# Altium footprint library 我的元件库01.PcbLib: 321 footprints (part 17 of 21)
Each footprint in its own frame and in the unit in brackets; x right, y up, seen from the top. Pads: shape width x height; smd on the part's side, far side on the other; paste and mask are expansions set on the pad; w line width, h text height; cw(c..) or ccw(c..) is an arc to the next point about the centre after c.
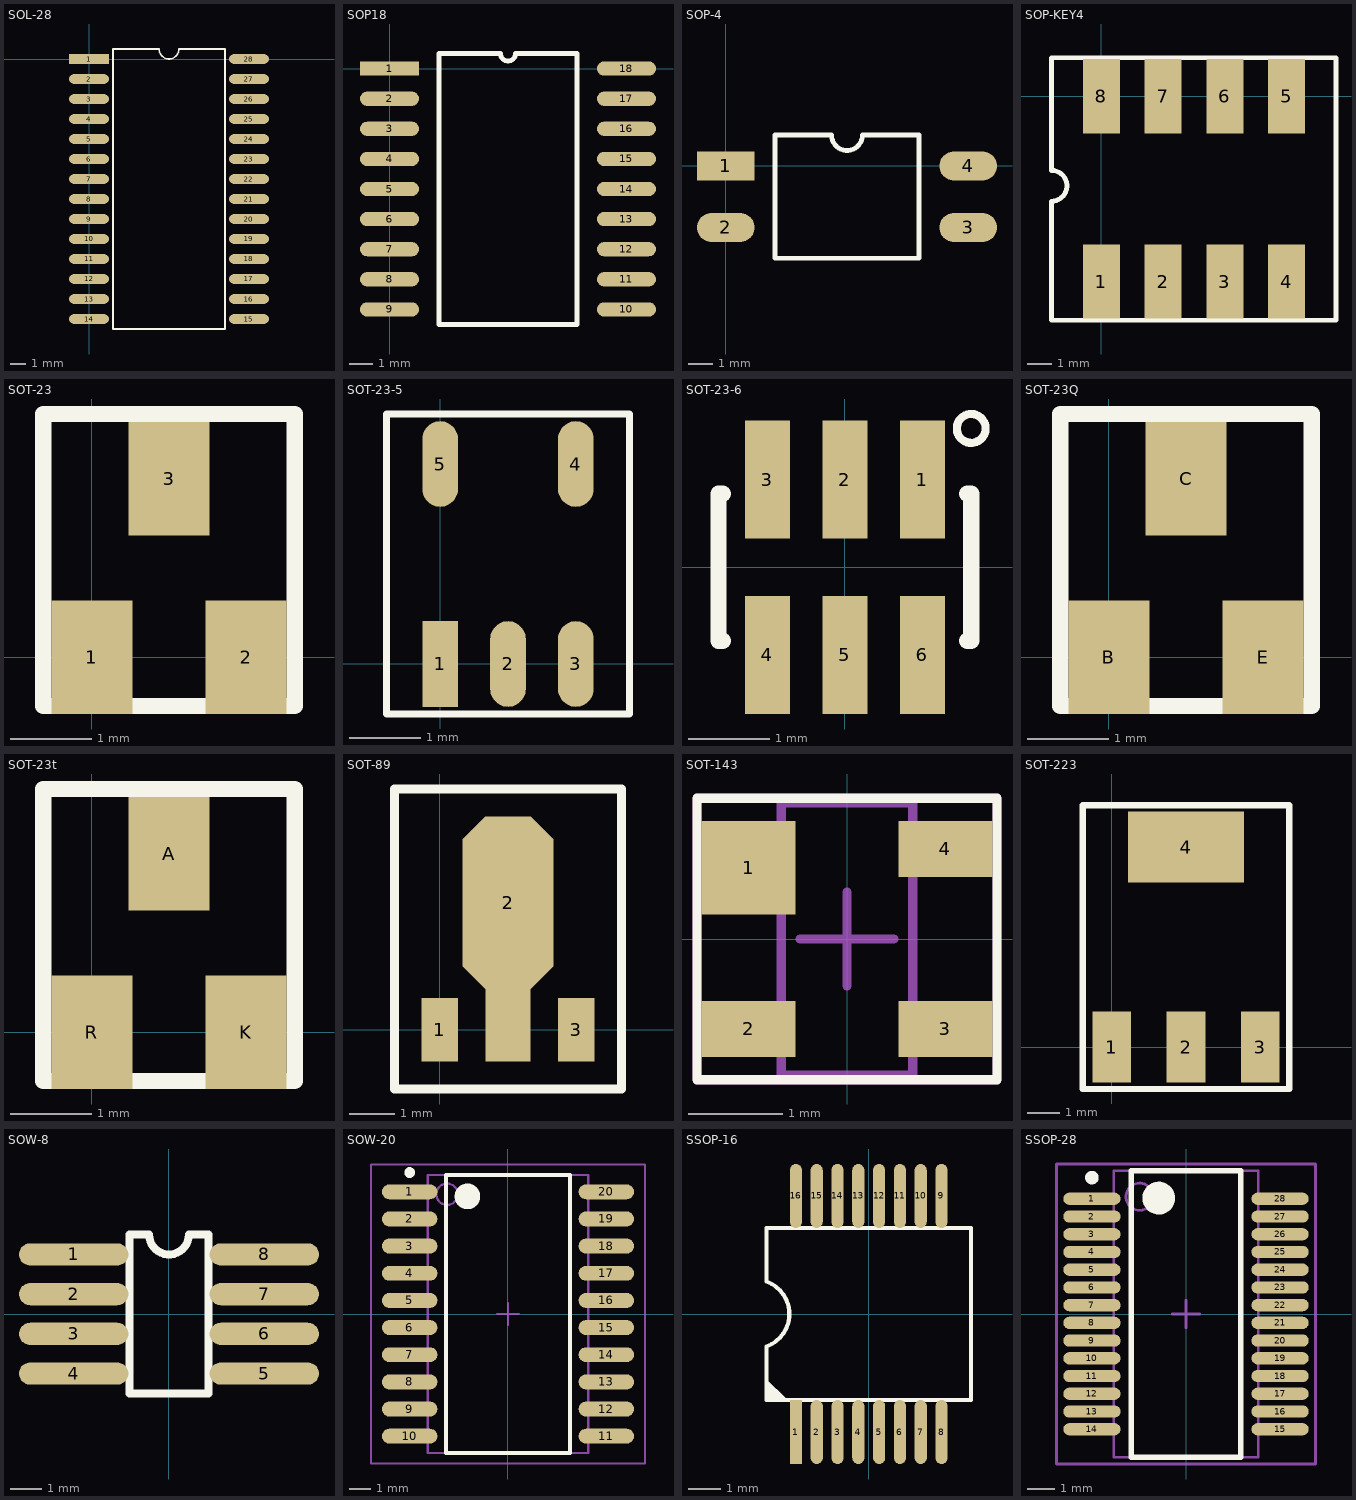
[diagram p16: the footprints below, top view; thin cyan lines are the x and y axes]

## SOL-28 [mil]
pads (28):
  rect 100x24 smd: 1(0,0)
  oval 100x24 smd: 2(0,-50) 3(0,-100) 4(0,-150) 5(0,-200) 6(0,-250) 7(0,-300) 8(0,-350) 9(0,-400) 10(0,-450) 11(0,-500) 12(0,-550) 13(0,-600) 14(0,-650) 15(400,-650) 16(400,-600) 17(400,-550) 18(400,-500) 19(400,-450) 20(400,-400) 21(400,-350) 22(400,-300) 23(400,-250) 24(400,-200) 25(400,-150) 26(400,-100) 27(400,-50) 28(400,0)
Top Overlay:
  lines w4: 60,-675 60,25 175,25 ccw(c200,25) 225,25 340,25 340,-675 60,-675
3D body "User Library-80072036 SO28.STEP": height 103.54, standoff -0.39, extent -12.08,-681.91 408,29.91

## SOP18 [mm]
pads (18):
  rect 2.5x0.6 smd: 1(0,0)
  oval 2.5x0.6 smd: 2(0,-1.27) 3(0,-2.54) 4(0,-3.81) 5(0,-5.08) 6(0,-6.35) 7(0,-7.62) 8(0,-8.89) 9(0,-10.16) 10(10,-10.16) 11(10,-8.89) 12(10,-7.62) 13(10,-6.35) 14(10,-5.08) 15(10,-3.81) 16(10,-2.54) 17(10,-1.27) 18(10,0)
Top Overlay:
  lines w0.2: 2.085,-10.795 2.085,0.635 4.683,0.635 ccw(c5,0.635) 5.318,0.635 7.915,0.635 7.915,-10.795 2.085,-10.795

## SOP-4 [mm] "PC817光耦"
height 4
pads (4):
  rect 2.38x1.2 smd: 1(0.005,0.003)
  oval 2.38x1.2 smd: 2(0.005,-2.537) 3(10.005,-2.537) 4(10.005,0.003)
Top Overlay:
  lines w0.2: 2.03,-3.807 7.98,-3.807 7.98,1.273 5.64,1.273 cw(c5.005,1.273) 4.37,1.273 2.03,1.273 2.03,-3.807
3D body "User Library-4-SMD.STEP": height 3.75, standoff -0.01, extent -0.025,-3.543 10.135,1.054

## SOP-KEY4 [mil]
pads (8):
  rect 60x120 smd: 1(0,-300) 2(100,-300) 3(200,-300) 4(300,-300) 5(300,0) 6(200,0) 7(100,0) 8(0,0)
Top Overlay:
  lines w7.87: -80.71,-120.08 cw(c-80.71,-145.08) -80.71,-170.08 -80.71,-362.6 380,-362.6 380,62.21 -80.71,62.21 -80.71,-118.9
3D body "User Library-DIPSW8.step": height 296, standoff -101, extent -76,-340 374,40

## SOT-23 [mm]
pads (3):
  rect 1x1.4 smd: 1(0,0) 2(1.9,0) 3(0.95,2.2)
Top Overlay:
  lines w0.2: -0.6,-0.6 2.5,-0.6 2.5,3 -0.6,3 -0.6,-0.6
3D body "SOT-23-3.STEP": height -0.38, standoff -1.58, extent -0.512,-0.181 2.388,2.619

## SOT-23-5 [mm]
pads (5):
  rect 0.5x1.2 smd: 1(0,0)
  oval 0.5x1.2 smd: 2(0.95,0) 3(1.9,0) 4(1.9,2.8) 5(0,2.8)
Top Overlay:
  lines w0.1: -0.75,-0.7 -0.75,3.5 2.65,3.5 2.65,-0.7 -0.75,-0.7
3D body "SOT-23-5.STEP": height -0.38, standoff -1.58, extent -0.487,0.073 2.413,2.873

## SOT-23-6 [mm] "SOT-23/SC-74A; 5 Leads; Body 3.1 x 3 mm, inc. leads (LxW max)"
height 1.45
pads (6):
  rect 0.55x1.45 smd: 1(0.95,1.075) 2(0,1.075) 3(-0.95,1.075) 4(-0.95,-1.075) 5(0,-1.075) 6(0.95,-1.075)
Top Overlay:
  circle w0.1: c1.549,1.702 r0.177
  lines w0.2: -1.5,-0.9 -1.55,-0.9 -1.55,0.9 -1.5,0.9 ; 1.5,-0.9 1.55,-0.9 1.55,0.9 1.5,0.9
3D body "User Library-SOT-23-6.STEP": height 1.08, standoff -0.01, extent -1.397,-1.194 1.397,1.232

## SOT-23Q [mm]
pads (3):
  rect 1x1.4 smd: B(0,0) C(0.95,2.2) E(1.9,0)
Top Overlay:
  lines w0.2: -0.6,-0.6 2.5,-0.6 2.5,3 -0.6,3 -0.6,-0.6
3D body "SOT-23-3.STEP": height -0.38, standoff -1.58, extent -0.457,-0.232 2.443,2.568

## SOT-23t [mm]
pads (3):
  rect 1x1.4 smd: A(0.95,2.2) K(1.9,0) R(0,0)
Top Overlay:
  lines w0.2: -0.6,-0.6 2.5,-0.6 2.5,3 -0.6,3 -0.6,-0.6
3D body "SOT-23-3.STEP": height -0.38, standoff -1.58, extent -0.485,-0.285 2.415,2.515

## SOT-89 [mm]
pads (4):
  rect 0.8x1.4 smd: 1(0,0) 3(3,0)
  oct 2x3.8 smd: 2(1.5,2.8)
  rect 1x1.854 smd: ""(1.5,0.227)
Top Overlay:
  lines w0.2: -1,-1.3 -1,5.3 4,5.3 4,-1.3 -1,-1.3
3D body "SOT-89.STEP": height -0.38, standoff -1.89, extent -0.737,-0.118 3.763,4.182

## SOT-143 [mm] "SOT143, 4-Leads, Body 3.0x2.6mm (max), Pitch 1.92mm, IPC Medium Density"
height 1.2
pads (4):
  rect 1x1 smd: 1(-1.05,0.76)
  rect 1x0.6 smd: 2(-1.05,-0.96) 3(1.05,-0.96) 4(1.05,0.96)
Top Overlay:
  lines w0.1: -1.6,-1.5 -1.6,1.5 1.6,1.5 1.6,-1.5 -1.6,-1.5
Mechanical 13:
  lines w0.1: -0.7,-1.45 -0.7,1.45 0.7,1.45 0.7,-1.45 -0.7,-1.45
Mechanical 15:
  lines w0.1: -0.5,0 0.5,0 ; 0,-0.5 0,0.5 ; -1.6,-1.5 1.6,-1.5 1.6,1.5 -1.6,1.5 -1.6,-1.5
3D body: height 1.2, standoff 0.15, extent -0.7,-1.52 0.7,1.52

## SOT-223 [mm]
pads (4):
  rect 1.2x2.2 smd: 1(0,0) 2(2.3,0) 3(4.6,0)
  rect 3.6x2.2 smd: 4(2.3,6.2)
Top Overlay:
  lines w0.2: -0.9,-1.3 -0.9,7.5 5.5,7.5 5.5,-1.3 -0.9,-1.3
3D body "SOT-223_MP04A.STEP": height -0.38, standoff -2.08, extent -0.965,-0.305 5.535,6.655

## SOW-8 [mil]
pads (8):
  oval 137.79x28 smd: 1(-120,75) 2(-120,25) 3(-120,-25) 4(-120,-75) 5(120,-75) 6(120,-25) 7(120,25) 8(120,75)
Top Overlay:
  lines w10: -28,100 -50,100 -50,-100 50,-100 50,100 25,100 cw(c0,100) -25,100
3D body "SO-8.STEP": height -15, standoff -81.93, extent -114.11,-97 122.11,95.91

## SOW-20 [mm] "SOIC, 20-Leads, Body 12.8x7.5mm, Pitch 1.27mm, IPC Low Density"
height 2.65
pads (20):
  oval 2.6x0.7 smd: 1(-4.6,5.715) 2(-4.6,4.445) 3(-4.6,3.175) 4(-4.6,1.905) 5(-4.6,0.635) 6(-4.6,-0.635) 7(-4.6,-1.905) 8(-4.6,-3.175) 9(-4.6,-4.445) 10(-4.6,-5.715) 11(4.6,-5.715) 12(4.6,-4.445) 13(4.6,-3.175) 14(4.6,-1.905) 15(4.6,-0.635) 16(4.6,0.635) 17(4.6,1.905) 18(4.6,3.175) 19(4.6,4.445) 20(4.6,5.715)
Top Overlay:
  circle w0.6: c-1.9,5.5 r0.3
  circle w0.25: c-4.6,6.615 r0.125
  lines w0.2: -2.9,-6.5 -2.9,6.5 2.9,6.5 2.9,-6.5 -2.9,-6.5
Mechanical 13:
  circle w0.1: c-2.85,5.6 r0.5
  lines w0.1: -3.75,-6.5 -3.75,6.5 3.75,6.5 3.75,-6.5 -3.75,-6.5
Mechanical 15:
  lines w0.1: -0.5,0 0.5,0 ; 0,-0.5 0,0.5 ; -6.4,-7 -6.4,7 6.4,7 6.4,-7 -6.4,-7
3D body "User Library-SOIC20-300.STEP": height 2.65, standoff 0, extent -5.105,-6.4 5.195,6.4

## SSOP-16 [mm]
height 2
pads (16):
  rect 0.38x2 smd: 1(-2.274,-3.688)
  oval 0.38x2 smd: 2(-1.625,-3.688) 3(-0.974,-3.688) 4(-0.325,-3.688) 5(0.326,-3.688) 6(0.975,-3.688) 7(1.626,-3.688) 8(2.275,-3.688) 9(2.275,3.688) 10(1.625,3.688) 11(0.975,3.688) 12(0.325,3.688) 13(-0.325,3.688) 14(-0.975,3.688) 15(-1.625,3.688) 16(-2.275,3.688)
Top Overlay:
  region: -3.2,-2.688 -3.2,-2.032 -2.598,-2.634 -2.592,-2.64 -2.584,-2.652 -2.578,-2.666 -2.576,-2.68 -2.576,-2.688
  lines w0.127: 3.2,-2.688 -3.2,-2.688 -3.2,-1.016 ccw(c-3.556,0) -3.2,1.016 -3.2,2.692 3.2,2.692 3.2,-2.662

## SSOP-28 [mm] "SOP, 28-Leads, Body 10.5x5.3mm (max), Pitch 0.65mm, IPC Medium Density"
height 2
pads (28):
  oval 2.1x0.45 smd: 1(-3.45,4.225) 2(-3.45,3.575) 3(-3.45,2.925) 4(-3.45,2.275) 5(-3.45,1.625) 6(-3.45,0.975) 7(-3.45,0.325) 8(-3.45,-0.325) 9(-3.45,-0.975) 10(-3.45,-1.625) 11(-3.45,-2.275) 12(-3.45,-2.925) 13(-3.45,-3.575) 14(-3.45,-4.225) 15(3.45,-4.225) 16(3.45,-3.575) 17(3.45,-2.925) 18(3.45,-2.275) 19(3.45,-1.625) 20(3.45,-0.975) 21(3.45,-0.325) 22(3.45,0.325) 23(3.45,0.975) 24(3.45,1.625) 25(3.45,2.275) 26(3.45,2.925) 27(3.45,3.575) 28(3.45,4.225)
Top Overlay:
  circle w0.25: c-3.45,5 r0.125
  circle w0.6: c-1,4.25 r0.3
  lines w0.2: -2,-5.25 -2,5.25 2,5.25 2,-5.25 -2,-5.25
Mechanical 13:
  circle w0.1: c-1.7,4.3 r0.5
  lines w0.1: -2.65,-5.25 -2.65,5.25 2.65,5.25 2.65,-5.25 -2.65,-5.25
Mechanical 15:
  lines w0.1: -0.5,0 0.5,0 ; 0,-0.5 0,0.5 ; -4.75,-5.5 -4.75,5.5 4.75,5.5 4.75,-5.5 -4.75,-5.5
3D body: height 2, standoff 0.25, extent -2.65,-5.25 2.65,5.25